# Altium footprint library Isidro_Library.PcbLib: 29 footprints (part 1 of 2)
Each footprint in its own frame and in the unit in brackets; x right, y up, seen from the top. Pads: shape width x height; smd on the part's side, far side on the other; paste and mask are expansions set on the pad; w line width, h text height; cw(c..) or ccw(c..) is an arc to the next point about the centre after c.
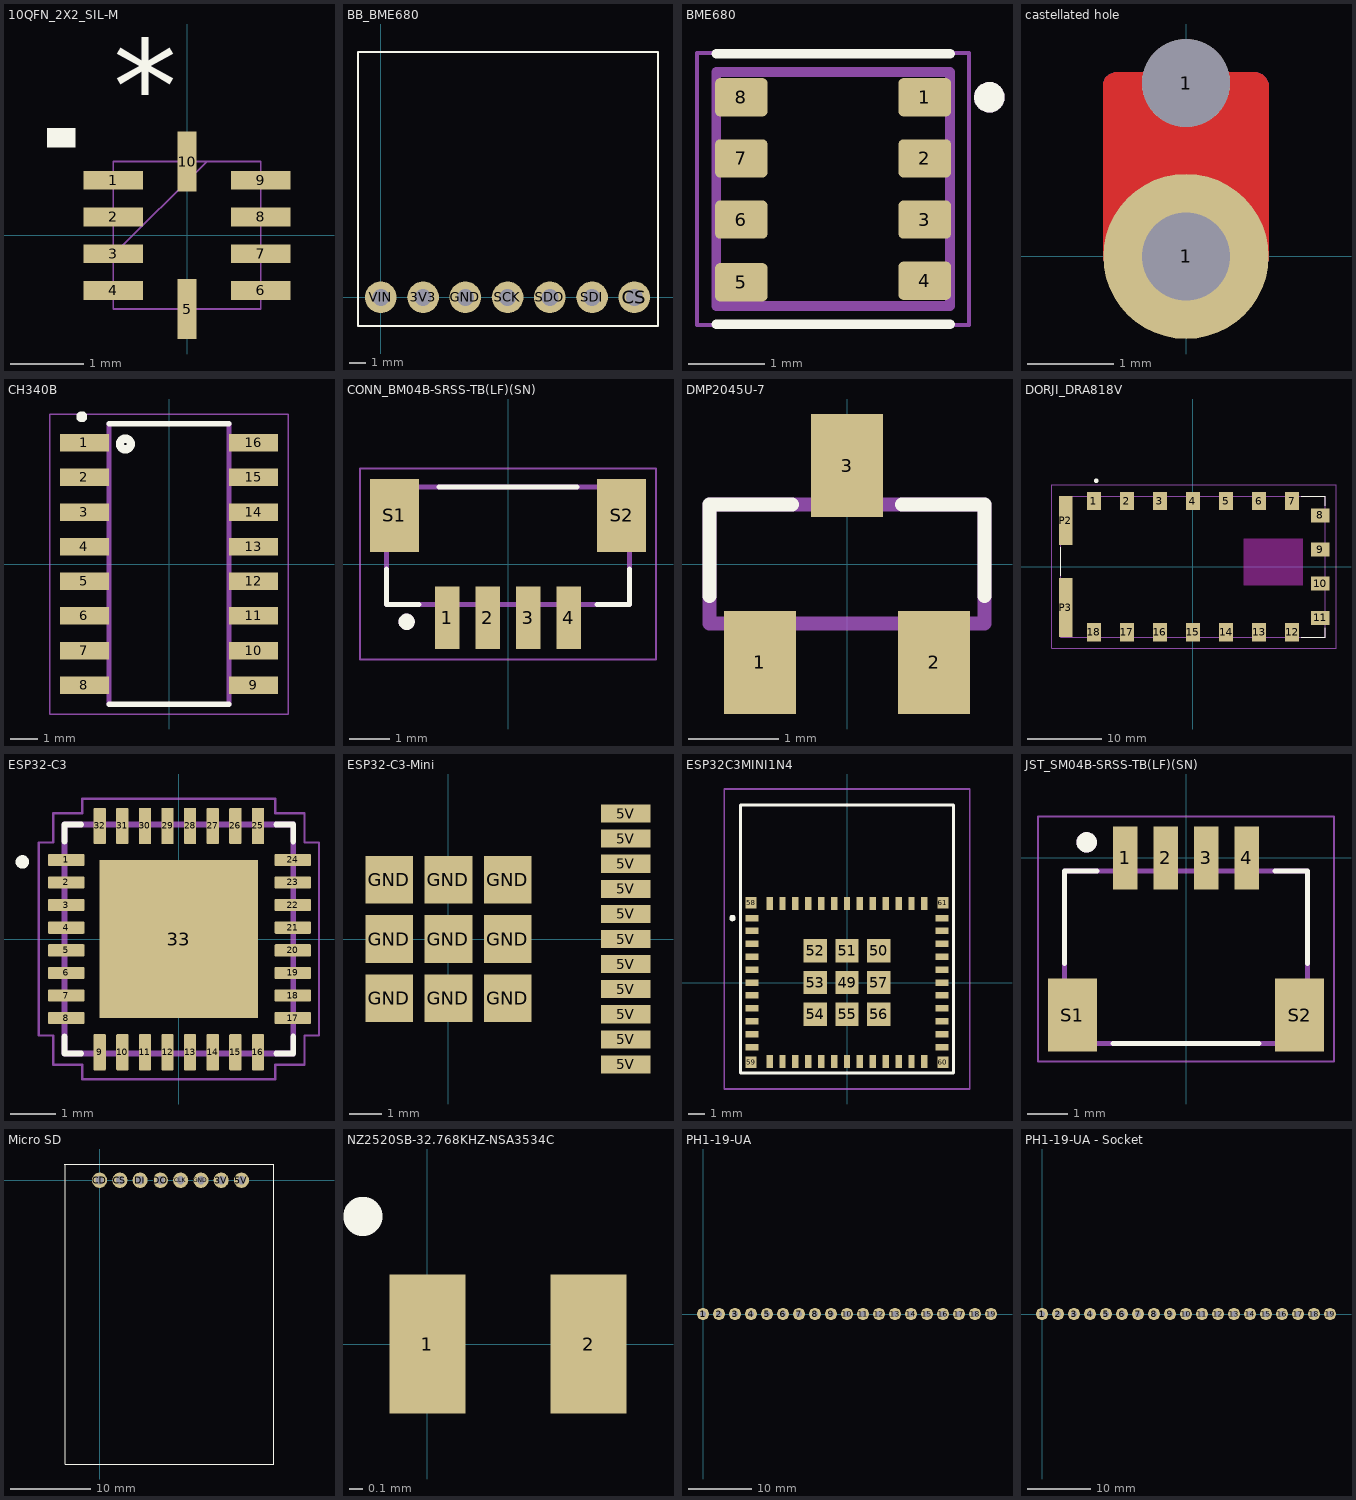
[diagram p0: the footprints below, top view; thin cyan lines are the x and y axes]

## 10QFN_2X2_SIL-M [mil]
pads (10):
  rect 32x10 smd paste+0 mask+0: 1(-39.5,29.53) 2(-39.5,9.84) 3(-39.5,-9.84) 4(-39.5,-29.53) 6(39.5,-29.53) 7(39.5,-9.84) 8(39.5,9.84) 9(39.5,29.53)
  rect 10x32 smd paste+0 mask+0: 5(0,-39.5) 10(0,39.5)
Top Overlay:
  region: -59.8,47.24 -74.8,47.24 -74.8,57.24 -59.8,57.24
  text "*" at -39.37,55.12 h50
Mechanical 13:
  lines w1: -39.5,-10.5 10.5,39.5 ; -39.5,-39.5 -39.5,39.5 39.5,39.5 39.5,-39.5 -39.5,-39.5 ; -39.5,-35.53 -39.5,-23.53 -39.5,-35.53 ; -39.5,-15.84 -39.5,-3.84 -39.5,-15.84 ; -39.5,3.84 -39.5,15.84 -39.5,3.84 ; -39.5,23.53 -39.5,35.53 -39.5,23.53 ; -6,-39.5 6,-39.5 -6,-39.5 ; -6,39.5 6,39.5 -6,39.5 ; 39.5,-35.53 39.5,-23.53 39.5,-35.53 ; 39.5,-15.84 39.5,-3.84 39.5,-15.84 ; 39.5,3.84 39.5,15.84 39.5,3.84 ; 39.5,23.53 39.5,35.53 39.5,23.53
3D body "10QFN_2X2_SIL.step": height 30.12, standoff 0, extent -39.49,-39.49 39.49,39.49

## BB_BME680 [mm]
pads (7):
  round 1.905 hole 1.02: 3V3(2.54,0) CS(15.24,0) GND(5.08,0) SCK(7.62,0) SDI(12.7,0) SDO(10.16,0) VIN(0,0)
Top Overlay:
  lines w0.127: -1.372,-1.727 -1.372,14.757 16.662,14.757 16.662,-1.727 -1.372,-1.727
3D body "PinSocket_1x07_P2.54mm_Vertical.step": height 7, standoff -3.1, extent -1.27,-1.27 16.51,1.27

## BME680 [mm]
pads (8):
  rrect25% 0.686x0.5 smd: 1(3.74,3.74) 2(3.74,2.94) 3(3.74,2.14) 4(3.74,1.34) 5(1.34,1.32) 6(1.34,2.14) 7(1.34,2.94) 8(1.34,3.74)
Top Overlay:
  circle w0.2: c4.585,3.74 r0.1
  lines w0.127: 1.01,0.77 4.07,0.77 ; 1.01,4.31 4.07,4.31
Mechanical 13:
  circle w0.2: c4.585,3.74 r0.1
  lines w0.127: 1.01,1.01 1.01,4.07 4.07,4.07 4.07,1.01 1.01,1.01
Mechanical 15:
  lines w0.05: 0.76,0.76 4.32,0.76 4.32,4.32 0.76,4.32 0.76,0.76
3D body "BME680--3DModel-STEP-56544.STEP": height 1, standoff 0, extent 1.04,1.04 4.04,4.04

## castellated hole [mil]
pads (2):
  round 75 hole 40 paste+0: 1(0,0)
  round 40 hole 40 paste+0: 1(0,78.74)
Top Layer:
  region: -37.5,-1.75 -37.5,77.75 -37.5,78.94 -36.59,81.15 -34.9,82.84 -32.69,83.75 -31.5,83.75 31,83.75 32.29,83.75 34.68,82.76 36.51,80.93 37.5,78.54 37.5,77.25 37.5,-2.25
Bottom Layer:
  region: -37.5,-1.75 -37.5,77.75 -37.5,78.94 -36.59,81.15 -34.9,82.84 -32.69,83.75 -31.5,83.75 31,83.75 32.29,83.75 34.68,82.76 36.51,80.93 37.5,78.54 37.5,77.25 37.5,-2.25
Top Solder:
  region: -41.5,0.14 -41.5,80.14 -41.5,81.13 -40.74,82.97 -39.33,84.38 -37.49,85.14 -36.5,85.14 34.5,85.14 35.69,85.34 38.05,84.79 40.02,83.39 41.3,81.33 41.5,80.14 41.5,0.14
Bottom Solder:
  region: -41.5,0 -41.5,80 -41.5,80.99 -40.74,82.83 -39.33,84.24 -37.49,85 -36.5,85 34.5,85 35.69,85.2 38.05,84.65 40.02,83.25 41.3,81.19 41.5,80 41.5,0

## CH340B [mm] "- USB 2.0 Transceiver 2Mbps SOP-16_150mil USB ICs ROHS"
pads (16):
  rect 1.8x0.64 smd: 1(-3.105,4.445) 2(-3.105,3.175) 3(-3.105,1.905) 4(-3.105,0.635) 5(-3.105,-0.635) 6(-3.105,-1.905) 7(-3.105,-3.175) 8(-3.105,-4.445) 9(3.105,-4.445) 10(3.105,-3.175) 11(3.105,-1.905) 12(3.105,-0.635) 13(3.105,0.635) 14(3.105,1.905) 15(3.105,3.175) 16(3.105,4.445)
Top Overlay:
  circle w0.2: c-3.2,5.4 r0.1
  circle w0.3: c-1.6,4.4 r0.2
  lines w0.2: -2.2,-5.15 2.2,-5.15 ; -2.2,5.15 2.2,5.15
Mechanical 13:
  lines w0.2: -2.2,-5.15 -2.2,5.15 ; 2.2,-5.15 2.2,5.15
Mechanical 15:
  lines w0.05: -4.375,-5.5 4.375,-5.5 4.375,5.5 -4.375,5.5 -4.375,-5.5
3D body "SOP-16.STEP": height 2.14, standoff 0.02, extent -3.555,-5.51 3.555,5.51

## CONN_BM04B-SRSS-TB(LF)(SN) [mm]
pads (6):
  rect 0.6x1.55 smd: 1(-1.5,-1.325) 2(-0.5,-1.325) 3(0.5,-1.325) 4(1.5,-1.325)
  rect 1.2x1.8 smd: S1(-2.8,1.2) S2(2.8,1.2)
Top Overlay:
  circle w0.2: c-2.5,-1.425 r0.1
  lines w0.127: -3,-0.125 -3,-1 -2.2,-1 ; -1.7,1.9 1.7,1.9 ; 2.2,-1 3,-1 3,-0.125
Mechanical 13:
  circle w0.2: c-2.5,-1.425 r0.1
  lines w0.127: -3,-1 -3,1.9 3,1.9 3,-1 -3,-1
Mechanical 15:
  lines w0.05: -3.65,-2.35 -3.65,2.35 3.65,2.35 3.65,-2.35 -3.65,-2.35
3D body "BM04B-SRSS-TB-LF--SN---3DModel-STEP-56544.STEP": height 4.35, standoff 0, extent -2.99,-1.845 3.01,1.755

## DMP2045U-7 [mil] "Canal P Montaje en superficie 20 V 4.3 A (Ta) 800mW (Ta) SOT-23-3"
pads (3):
  rect 31.5x45 smd: 1(-38,-43) 2(38,-43) 3(0,43)
Top Overlay:
  lines w6: -60,-14 -60,26 -24,26 ; 24,26 60,26 60,-14
Mechanical 13:
  lines w6: -60,-26 -60,26 60,26 60,-26 -60,-26 ; -48,-52 -28,-52 -28,-26 -48,-26 -48,-52 ; -10,26 -10,52 10,52 10,26 -10,26 ; 28,-52 48,-52 48,-26 28,-26 28,-52
3D body "SOT-23-3.STEP": height 44.09, standoff 0, extent -57.48,-46.65 57.48,46.65

## DORJI_DRA818V [mm]
pads (20):
  rect 1.88x2.47 smd: 1(-13.35,8.825) 2(-8.9,8.825) 3(-4.45,8.825) 4(0,8.825) 5(4.45,8.825) 6(8.9,8.825) 7(13.35,8.825) 12(13.35,-8.825) 13(8.9,-8.825) 14(4.45,-8.825) 15(0,-8.825) 16(-4.45,-8.825) 17(-8.9,-8.825) 18(-13.35,-8.825)
  rect 2.47x1.88 smd: 8(17.125,6.9) 9(17.125,2.3) 10(17.125,-2.3) 11(17.125,-6.9)
  rect 1.8x6.6 smd: P2(-17.125,6.2)
  rect 1.8x8 smd: P3(-17.125,-5.5)
Top Overlay:
  circle w0.3: c-13.02,11.56 r0.15
  lines w0.127: -17.8,-1.2 -17.8,2.6 ; 14.6,-9.5 17.8,-9.5 17.8,-8.2 ; 14.6,9.5 17.8,9.5 17.8,8.2
Keep-Out Layer:
  region: 14.8,-2.504 6.81,-2.504 6.81,3.75 14.8,3.75
  region: 14.8,-2.502 6.804,-2.502 6.804,3.75 14.8,3.75
Mechanical 13:
  lines w0.127: -17.8,-9.5 17.8,-9.5 17.8,9.5 -17.8,9.5 -17.8,-9.5
Mechanical 15:
  lines w0.05: -19,-11 19.25,-11 19.25,11 -19,11 -19,-11
3D body "DRA818U.SLDPRT": height 2.83, standoff 0.03, extent -17.851,-9.576 17.749,9.424

## ESP32-C3 [mm]
pads (33):
  rrect15% 0.8x0.27 smd: 1(-2.49,1.75) 2(-2.49,1.25) 3(-2.49,0.75) 4(-2.49,0.25) 5(-2.49,-0.25) 6(-2.49,-0.75) 7(-2.49,-1.25) 8(-2.49,-1.75) 17(2.52,-1.75) 18(2.52,-1.25) 19(2.52,-0.75) 20(2.52,-0.25) 21(2.52,0.25) 22(2.52,0.75) 23(2.52,1.25) 24(2.52,1.75)
  rrect15% 0.27x0.8 smd: 9(-1.75,-2.505) 10(-1.25,-2.505) 11(-0.75,-2.505) 12(-0.25,-2.505) 13(0.25,-2.505) 14(0.75,-2.505) 15(1.25,-2.505) 16(1.75,-2.505) 25(1.75,2.5) 26(1.25,2.5) 27(0.75,2.5) 28(0.25,2.5) 29(-0.25,2.5) 30(-0.75,2.5) 31(-1.25,2.5) 32(-1.75,2.5)
  rect 3.5x3.5 smd paste-3: 33(0,0)
Top Overlay:
  circle w0.15: c-3.46,1.705 r0.075
  lines w0.127: -2.53,-2.156 -2.53,-2.53 -2.156,-2.53 ; -2.53,2.156 -2.53,2.53 -2.156,2.53 ; 2.156,-2.53 2.53,-2.53 2.53,-2.156 ; 2.156,2.53 2.53,2.53 2.53,2.156
Top Paste:
  region: 1.17,-1.172 -1.172,-1.172 -1.172,1.17 1.17,1.17
Mechanical 13:
  lines w0.127: -2.53,-2.53 2.53,-2.53 2.53,2.53 -2.53,2.53 -2.53,-2.53
Mechanical 15:
  lines w0.05: -3.1,-2.135 -3.1,2.135 -2.78,2.135 -2.78,2.78 -2.135,2.78 -2.135,3.1 2.135,3.1 2.135,2.78 2.78,2.78 2.78,2.135 3.1,2.135 3.1,-2.135 2.78,-2.135 2.78,-2.78 2.135,-2.78 2.135,-3.1 -2.135,-3.1 -2.135,-2.78 -2.78,-2.78 -2.78,-2.135 -3.1,-2.135
3D body "ESP32-C3.STEP": height 0.91, standoff 0.01, extent -2.495,-2.49 2.505,2.51

## ESP32-C3-Mini [mm]
pads (20):
  rect 1.5x0.55 smd: 5V(5.4,-3.818) 5V(5.4,-3.055) 5V(5.4,-2.291) 5V(5.4,-1.527) 5V(5.4,-0.764) 5V(5.4,0) 5V(5.4,0.764) 5V(5.4,1.527) 5V(5.4,2.291) 5V(5.4,3.055) 5V(5.4,3.818)
  rect 1.45x1.45 smd: GND(-1.8,-1.8) GND(-1.8,0) GND(-1.8,1.8) GND(0,-1.8) GND(0,0) GND(0,1.8) GND(1.8,-1.8) GND(1.8,0) GND(1.8,1.8)

## ESP32C3MINI1N4 [mm]
pads (61):
  rect 0.8x0.4 smd: 1(-5.9,4) 2(-5.9,3.2) 3(-5.9,2.4) 4(-5.9,1.6) 5(-5.9,0.8) 6(-5.9,0) 7(-5.9,-0.8) 8(-5.9,-1.6) 9(-5.9,-2.4) 10(-5.9,-3.2) 11(-5.9,-4) 25(5.9,-4) 26(5.9,-3.2) 27(5.9,-2.4) 28(5.9,-1.6) 29(5.9,-0.8) 30(5.9,0) 31(5.9,0.8) 32(5.9,1.6) 33(5.9,2.4) 34(5.9,3.2) 35(5.9,4)
  rect 0.4x0.8 smd: 12(-4.8,-4.9) 13(-4,-4.9) 14(-3.2,-4.9) 15(-2.4,-4.9) 16(-1.6,-4.9) 17(-0.8,-4.9) 18(0,-4.9) 19(0.8,-4.9) 20(1.6,-4.9) 21(2.4,-4.9) 22(3.2,-4.9) 23(4,-4.9) 24(4.8,-4.9) 36(4.8,4.9) 37(4,4.9) 38(3.2,4.9) 39(2.4,4.9) 40(1.6,4.9) 41(0.8,4.9) 42(0,4.9) 43(-0.8,4.9) 44(-1.6,4.9) 45(-2.4,4.9) 46(-3.2,4.9) 47(-4,4.9) 48(-4.8,4.9)
  rect 1.45x1.45 smd: 49(0,0) 50(1.975,1.975) 51(0,1.975) 52(-1.975,1.975) 53(-1.975,0) 54(-1.975,-1.975) 55(0,-1.975) 56(1.975,-1.975) 57(1.975,0)
  rect 0.7x0.7 smd: 58(-5.95,4.95) 59(-5.95,-4.95) 60(5.95,-4.95) 61(5.95,4.95)
Top Overlay:
  lines w0.2: -7.2,4 ccw(c-7.1,4) -7,4 ccw(c-7.1,4) -7.2,4 ; -6.6,-5.6 6.6,-5.6 6.6,5.7 6.6,11 -6.6,11 -6.6,5.7 -6.6,-5.6
Mechanical 13:
  lines w0.1: -6.6,-5.6 -6.6,11 6.6,11 6.6,-5.6 -6.6,-5.6
Mechanical 15:
  lines w0.1: -7.6,-6.6 -7.6,12 7.6,12 7.6,-6.6 -7.6,-6.6
3D body "ESP32-C3-MINI-1.STEP": height 2.5, standoff 0.1, extent -6.6,-5.5 6.6,11.1

## JST_SM04B-SRSS-TB(LF)(SN) [mm]
pads (6):
  rect 0.6x1.55 smd: 1(-1.5,0) 2(-0.5,0) 3(0.5,0) 4(1.5,0)
  rect 1.2x1.8 smd: S1(-2.8,-3.875) S2(2.8,-3.875)
Top Overlay:
  circle w0.3: c-2.45,0.385 r0.1
  lines w0.127: -3,-2.6 -3,-0.325 -2.2,-0.325 ; -1.8,-4.575 1.8,-4.575 ; 2.2,-0.325 3,-0.325 3,-2.6
Mechanical 13:
  circle w0.3: c-2.45,0.385 r0.1
  lines w0.127: -3,-4.575 3,-4.575 3,-0.325 -3,-0.325 -3,-4.575
Mechanical 15:
  lines w0.05: -3.65,-5.025 3.65,-5.025 3.65,1.025 -3.65,1.025 -3.65,-5.025
3D body "SM04B-SRSS-TB(LF)(SN)--3DModel-STEP-56544.STEP": height 2.98, standoff 0.02, extent -3,-4.5 3,0.45

## Micro SD [mm]
pads (8):
  round 1.905 hole 1.02: 3V(15.24,0) 5V(17.78,0) CD(0,0) CLK(10.16,0) CS(2.54,0) DI(5.08,0) DO(7.62,0) GND(12.7,0)
Top Overlay:
  lines w0.127: -4.445,2.032 21.844,2.032 21.844,-35.56 -4.318,-35.56 -4.318,2.032
3D body "Ada microsd.STEP": height 5.39, standoff 2.79, extent -3.937,-35.353 21.463,1.317
3D body "PinHeader_1x08_P2.54mm_Vertical.step": height 8.54, standoff -3, extent -1.27,-1.27 19.05,1.27

## NZ2520SB-32.768KHZ-NSA3534C [mm] "CRYSTAL 32.7680KHZ 9PF SMD"
pads (2):
  rect 0.55x1 smd: 1(0,0) 2(1.16,0)
Top Overlay:
  circle w0.254: c-0.465,0.92 r0.014
3D body "ABS07-32.768KHZ-9-1-T.STEP": height 0.9, standoff 0, extent -1.02,-0.725 2.18,0.775

## PH1-19-UA [mm] "Connector Header Through Hole 19 position 0.100\" (2.54mm)"
pads (19):
  round 1.905 hole 1.02: 1(0,0) 2(2.54,0) 3(5.08,0) 4(7.62,0) 5(10.16,0) 6(12.7,0) 7(15.24,0) 8(17.78,0) 9(20.32,0) 10(22.86,0) 11(25.4,0) 12(27.94,0) 13(30.48,0) 14(33.02,0) 15(35.56,0) 16(38.1,0) 17(40.64,0) 18(43.18,0) 19(45.72,0)
3D body "PinHeader_1x19_P2.54mm_Vertical.step": height 8.54, standoff -3, extent -1.27,-1.27 46.99,1.27

## PH1-19-UA - Socket [mm] "Connector Header Through Hole 19 position 0.100\" (2.54mm)"
pads (19):
  round 1.905 hole 1.02: 1(0,0) 2(2.54,0) 3(5.08,0) 4(7.62,0) 5(10.16,0) 6(12.7,0) 7(15.24,0) 8(17.78,0) 9(20.32,0) 10(22.86,0) 11(25.4,0) 12(27.94,0) 13(30.48,0) 14(33.02,0) 15(35.56,0) 16(38.1,0) 17(40.64,0) 18(43.18,0) 19(45.72,0)
3D body "PinSocket_1x19_P2.54mm_Vertical.step": height 7, standoff -3.1, extent -1.27,-1.27 46.99,1.27